# Altium footprint library PTH-Footprint.PcbLib: 58 footprints (part 2 of 4)
Each footprint in its own frame and in the unit in brackets; x right, y up, seen from the top. Pads: shape width x height; smd on the part's side, far side on the other; paste and mask are expansions set on the pad; w line width, h text height; cw(c..) or ccw(c..) is an arc to the next point about the centre after c.
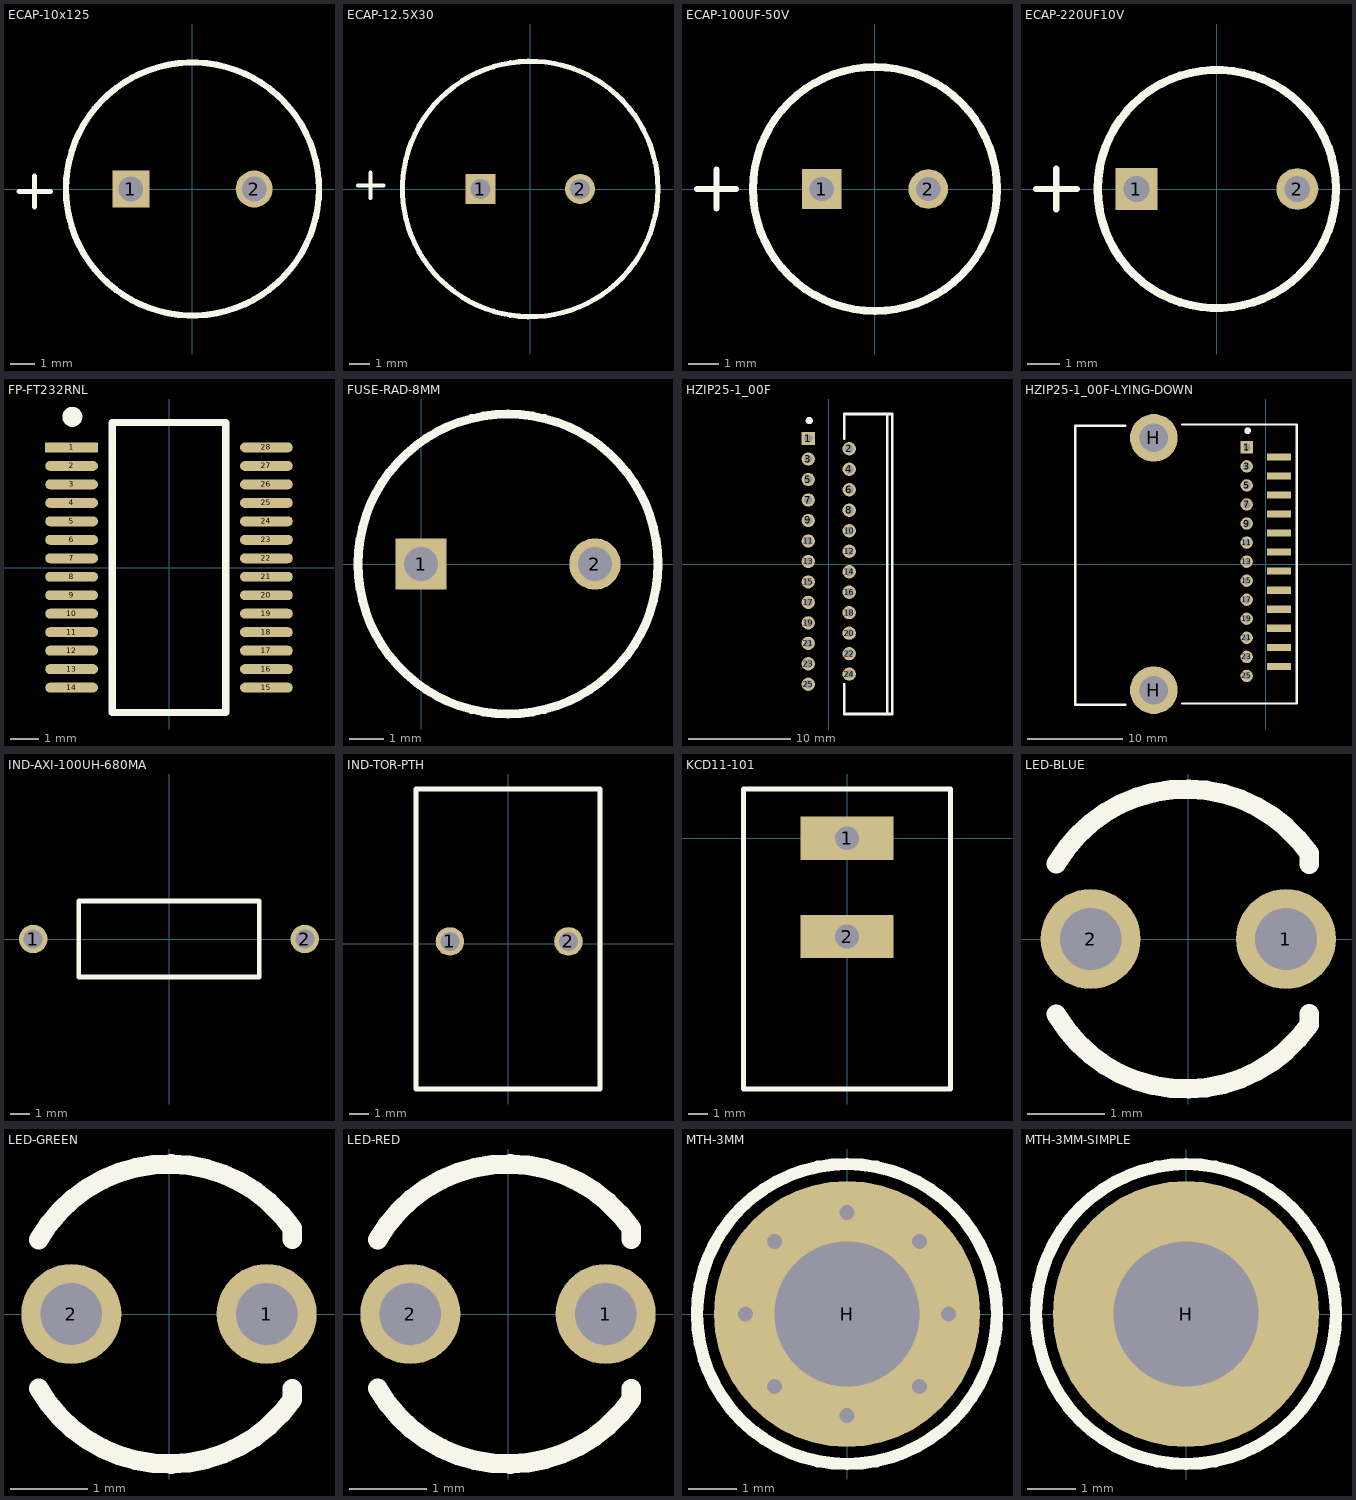
[diagram p1: the footprints below, top view; thin cyan lines are the x and y axes]

## ECAP-10x125 [mm]
pads (2):
  rect 1.5x1.5 hole 1 paste-2539.97 mask+0: 1(-2.502,0)
  round 1.5 hole 1 paste-2539.97 mask+0: 2(2.502,0)
Top Overlay:
  circle w0.254: c0,0 r5.131
  lines w0.2: -7.035,-0.1 -5.765,-0.1 ; -6.4,-0.735 -6.4,0.535
3D body "ECA1HM221.step": height 12.5, standoff -17, extent -4.989,-5 5,5

## ECAP-12.5X30 [mm]
pads (2):
  rect 1.5x1.5 hole 1 paste-2539.97 mask+0: 1(-2.489,0)
  round 1.5 hole 1 paste-2539.97 mask+0: 2(2.489,0)
Top Overlay:
  circle w0.254: c0,0 r6.375
  lines w0.2: -8.597,0.176 -7.327,0.176 ; -7.962,-0.459 -7.962,0.811
3D body "EEUFM1H681L.step": height 30, standoff -17, extent -6.228,-6.246 6.25,6.246

## ECAP-100UF-50V [mm]
pads (2):
  rect 1.3x1.3 hole 0.8: 1(-1.75,0)
  round 1.3 hole 0.8: 2(1.75,0)
Top Overlay:
  circle w0.254: c0,0 r4
  lines w0.2: -5.835,0 -4.565,0 ; -5.2,-0.635 -5.2,0.635
3D body "step_temp.STEP": height 11.5, standoff -17, extent -4,-3.992 4,3.992

## ECAP-220UF10V [mm]
pads (2):
  rect 1.3x1.3 hole 0.8: 1(-2.5,0)
  round 1.3 hole 0.8: 2(2.5,0)
Top Overlay:
  circle w0.254: c0,0 r3.7
  lines w0.2: -5.62,0 -4.35,0 ; -4.985,-0.635 -4.985,0.635
3D body "step_temp.STEP": height 11.2, standoff -17, extent -3.15,-3.141 3.15,3.141

## FP-FT232RNL [mm]
pads (28):
  rect 1.855x0.35 smd paste+0 mask+0: 1(-3.426,4.225)
  rrect100% 1.855x0.35 smd paste+0 mask+0: 2(-3.426,3.575) 3(-3.426,2.925) 4(-3.426,2.275) 5(-3.426,1.625) 6(-3.426,0.975) 7(-3.426,0.325) 8(-3.426,-0.325) 9(-3.426,-0.975) 10(-3.426,-1.625) 11(-3.426,-2.275) 12(-3.426,-2.925) 13(-3.426,-3.575) 14(-3.426,-4.225) 15(3.426,-4.225) 16(3.426,-3.575) 17(3.426,-2.925) 18(3.426,-2.275) 19(3.426,-1.625) 20(3.426,-0.975) 21(3.426,-0.325) 22(3.426,0.325) 23(3.426,0.975) 24(3.426,1.625) 25(3.426,2.275) 26(3.426,2.925) 27(3.426,3.575) 28(3.426,4.225)
Top Overlay:
  circle w0.5: c-3.4,5.3 r0.1
  lines w0.254: -1.998,-5.1 1.998,-5.1 1.998,5.1 -1.998,5.1 -1.998,-5.1
3D body "IC_FTDI_FT232RNL-REEL_eec-BLK.STEP": height 2, standoff 0, extent -3.9,-5.1 3.9,5.1

## FUSE-RAD-8MM [mm]
pads (2):
  rect 1.5x1.5 hole 1 paste-2539.97 mask+0: 1(0,0)
  round 1.5 hole 1 paste-2539.97 mask+0: 2(5.08,0)
Top Overlay:
  circle w0.254: c2.54,0 r4.381
3D body "Littelfuse 372 TR5.step": height 8.5, standoff -7.6, extent -1.707,-4.112 6.787,4.377

## HZIP25-1_00F [mm] "FM, 25-Leads, Body 4.5x29.3mm, Pitch 1mm"
height 19.17
pads (25):
  rect 1.3x1.3 hole 0.8: 1(-2,12.25)
  round 1.3 hole 0.8: 2(2,11.25) 3(-2,10.25) 4(2,9.25) 5(-2,8.25) 6(2,7.25) 7(-2,6.25) 8(2,5.25) 9(-2,4.25) 10(2,3.25) 11(-2,2.25) 12(2,1.25) 13(-2,0.25) 14(2,-0.75) 15(-2,-1.75) 16(2,-2.75) 17(-2,-3.75) 18(2,-4.75) 19(-2,-5.75) 20(2,-6.75) 21(-2,-7.75) 22(2,-8.75) 23(-2,-9.75) 24(2,-10.75) 25(-2,-11.75)
Top Overlay:
  circle w0.5: c-1.9,14 r0.1
  lines w0.254: 1.525,-11.75 1.525,-14.65 6.225,-14.65 6.225,14.65 1.525,14.65 1.525,12.25 ; 5.725,-14.65 5.725,14.65
3D body "TB6600HG-WN-NEW.STEP": height 21.08, standoff -1.54, extent -2.32,-14.67 6.09,14.63

## HZIP25-1_00F-LYING-DOWN [mm] "FM, 25-Leads, Body 4.5x29.3mm, Pitch 1mm"
height 19.17
pads (27):
  rect 1.3x1.3 hole 0.8: 1(-2,12.25)
  rect 2.5x0.75 smd: 2(1.4,11.25) 4(1.4,9.25) 6(1.4,7.25) 8(1.4,5.25) 10(1.4,3.25) 12(1.4,1.25) 14(1.4,-0.75) 16(1.4,-2.75) 18(1.4,-4.75) 20(1.4,-6.75) 22(1.4,-8.75) 24(1.4,-10.75)
  round 1.3 hole 0.8: 3(-2,10.25) 5(-2,8.25) 7(-2,6.25) 9(-2,4.25) 11(-2,2.25) 13(-2,0.25) 15(-2,-1.75) 17(-2,-3.75) 19(-2,-5.75) 21(-2,-7.75) 23(-2,-9.75) 25(-2,-11.75)
  round 5 hole 3: H(-11.75,-13.25) H(-11.75,13.25)
Top Overlay:
  circle w0.5: c-1.9,14 r0.1
  lines w0.254: -14.75,-14.8 -20,-14.8 -20,14.5 -14.75,14.5 ; -8.75,-14.65 3.25,-14.65 3.25,14.65 -8.75,14.65
3D body "TB6600HG-DEITADO.STEP": height 4.21, standoff -0.45, extent -19.813,-14.7 2.25,14.6

## IND-AXI-100UH-680MA [mm]
height 4
pads (2):
  round 1.5 hole 1: 1(-7.15,0) 2(7.15,0)
Top Overlay:
  lines w0.254: -4.75,-2 -4.75,2 4.75,2 4.75,-2 -4.75,-2
3D body "B78108E1104J009.step": height 3.99, standoff -20.85, extent -7.55,-2 7.55,2

## IND-TOR-PTH [mm]
pads (2):
  round 1.5 hole 1: 1(-3.048,0.127) 2(3.175,0.127)
Top Overlay:
  lines w0.254: -4.826,-7.62 -4.826,8.128 4.826,8.128 4.826,-7.62 -4.826,-7.62
3D body "MY_MOD.STEP": height 15.88, standoff -2.01, extent -3.37,-7.29 3.37,7.543

## KCD11-101 [mm]
pads (2):
  rect 4.75x2.2 hole 1.2 square: 1(0,0) 2(0,-5)
Top Overlay:
  lines w0.254: -5.25,-12.75 -5.25,2.5 5.25,2.5 5.25,-12.75 -5.25,-12.75
3D body "User Library-KCD11.STEP": height 14.51, standoff -4.5, extent -5.25,-12.631 5.25,2.431

## LED-BLUE [mm] "THT Mono-color Round LED, 2-leads"
height 10.5
pads (2):
  round 1.3 hole 0.8: 1(1.27,0) 2(-1.27,0)
Top Overlay:
  lines w0.254: -1.716,-0.98 ccw(c-0.03,0) 1.571,-1.114 1.571,-0.971 ; -1.716,0.98 cw(c-0.03,0) 1.571,1.114 1.571,0.971
3D body "LED D3 - Blue_cutted.step": height 5.3, standoff -5.1, extent -1.95,-1.95 1.62,1.95

## LED-GREEN [mm] "THT Mono-color Round LED, 2-leads"
height 10.5
pads (2):
  round 1.3 hole 0.8: 1(1.27,0) 2(-1.27,0)
Top Overlay:
  lines w0.254: -1.693,-0.967 ccw(c0,0) 1.601,-1.114 1.601,-0.971 ; -1.693,0.967 cw(c0,0) 1.601,1.114 1.601,0.971
3D body "LED D3 - Green_cutted.step": height 5.3, standoff -5.1, extent -1.95,-1.95 1.62,1.95

## LED-RED [mm] "THT Mono-color Round LED, 2-leads"
height 10.5
pads (2):
  round 1.3 hole 0.8: 1(1.27,0) 2(-1.27,0)
Top Overlay:
  lines w0.254: -1.693,-0.967 ccw(c0,0) 1.601,-1.114 1.601,-0.971 ; -1.693,0.967 cw(c0,0) 1.601,1.114 1.601,0.971
3D body "LED D3 - Red_cutted.step": height 5.3, standoff -5.1, extent -1.95,-1.95 1.62,1.95

## MTH-3MM [mm]
pads (1):
  round 5.5 hole 3: H(0,0)
via -2.1,0 diameter 0.61 hole 0.305
via -1.5,-1.5 diameter 0.61 hole 0.305
via 0,-2.1 diameter 0.61 hole 0.305
via 1.5,-1.5 diameter 0.61 hole 0.305
via 2.1,0 diameter 0.61 hole 0.305
via 1.5,1.5 diameter 0.61 hole 0.305
via -1.5,1.5 diameter 0.61 hole 0.305
via 0,2.1 diameter 0.61 hole 0.305
Top Overlay:
  circle w0.254: c0,0 r3.1
3D body "M3x8_Standoff-Dourado.STEP": height -0.4, standoff -8.4, extent -2.856,-2.5 2.856,2.5
3D body "M3x8_Standoff-Aluminio.STEP": height 1.8, standoff -6, extent -2.648,-2.646 2.648,2.646

## MTH-3MM-SIMPLE [mm]
pads (1):
  round 5.5 hole 3: H(0,0)
Top Overlay:
  circle w0.254: c0,0 r3.1
3D body "M3x8_Standoff-Dourado.STEP": height -0.4, standoff -8.4, extent -2.856,-2.5 2.856,2.5
3D body "M3x8_Standoff-Aluminio.STEP": height 1.8, standoff -6, extent -2.648,-2.646 2.648,2.646